# Altium footprint library Cap.PcbLib: 102 footprints (part 7 of 7)
Each footprint in its own frame and in the unit in brackets; x right, y up, seen from the top. Pads: shape width x height; smd on the part's side, far side on the other; paste and mask are expansions set on the pad; w line width, h text height; cw(c..) or ccw(c..) is an arc to the next point about the centre after c.
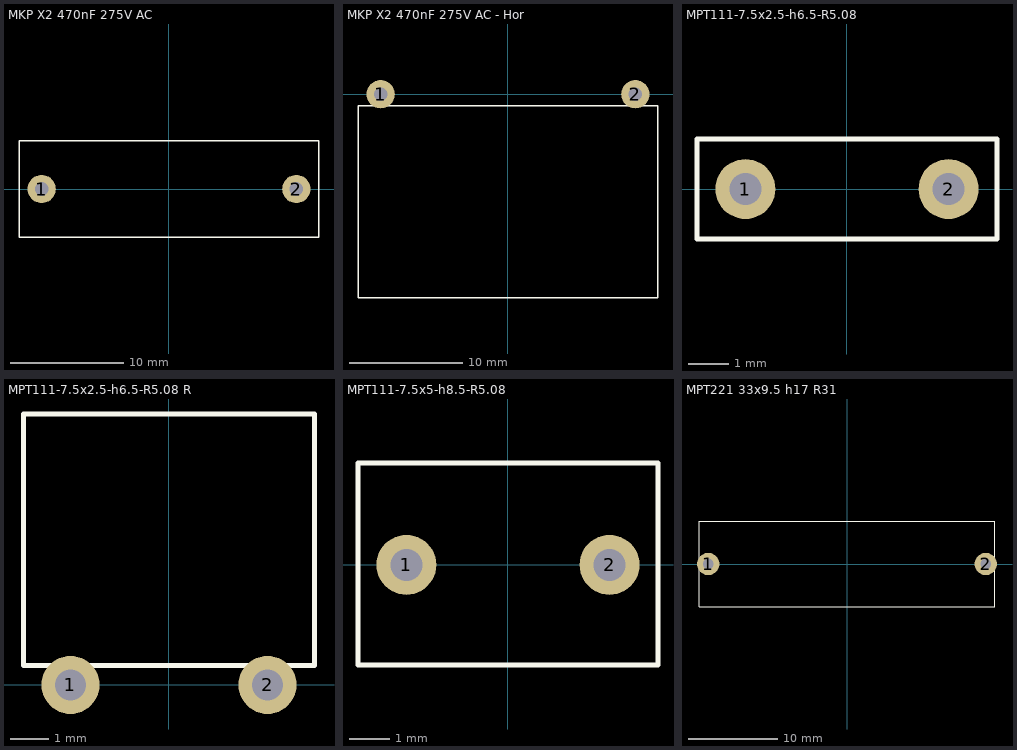
[diagram p6: the footprints below, top view; thin cyan lines are the x and y axes]

## MKP X2 470nF 275V AC [mm]
pads (2):
  round 2.5 hole 1.2: 1(-11.25,0) 2(11.25,0)
TopOverlay:
  lines w0.127: -13.25,-4.25 -13.25,4.25 13.25,4.25 13.25,-4.25 -13.25,-4.25
3D body: height 17, standoff -2.54, extent -13.25,-4.25 13.25,4.25

## MKP X2 470nF 275V AC - Hor [mm]
pads (2):
  round 2.5 hole 1.2: 1(-11.25,0) 2(11.25,0)
TopOverlay:
  lines w0.127: -13.25,-18 13.25,-18 13.25,-1 -13.25,-1 -13.25,-18
3D body: height 8.5, standoff -2.54, extent -13.25,-18 13.25,0.4

## MPT111-7.5x2.5-h6.5-R5.08 [mm]
pads (2):
  round 1.5 hole 0.8: 1(-2.54,0) 2(2.54,0)
TopOverlay:
  lines w0.127: -3.75,-1.25 -3.75,1.25 3.75,1.25 3.75,-1.25 -3.75,-1.25
3D body: height 6.5, standoff -2.54, extent -3.75,-1.25 3.75,1.25

## MPT111-7.5x2.5-h6.5-R5.08 R [mm]
pads (2):
  round 1.5 hole 0.8: 1(-2.54,0) 2(2.54,0)
TopOverlay:
  lines w0.127: -3.75,0.5 3.75,0.5 3.75,6.985 -3.75,6.985 -3.75,0.5
3D body: height 2.5, standoff -2.5, extent -3.75,-0.3 3.75,7

## MPT111-7.5x5-h8.5-R5.08 [mm]
pads (2):
  round 1.5 hole 0.8: 1(-2.54,0) 2(2.54,0)
TopOverlay:
  lines w0.127: -3.75,-2.5 -3.75,2.54 3.75,2.54 3.75,-2.5 -3.75,-2.5
3D body: height 8.5, standoff -2.54, extent -3.75,-2.5 3.75,2.5

## MPT221 33x9.5 h17 R31 [mm]
pads (2):
  round 2.5 hole 1.2: 1(-15.5,0) 2(15.5,0)
TopOverlay:
  lines w0.127: -16.51,-4.75 -16.51,4.75 16.51,4.75 16.51,-4.75 -16.51,-4.75
3D body: height 18, standoff -2, extent -16.5,-4.75 16.5,4.75